# Altium footprint library SVP_Phoenix.PcbLib: 53 footprints (part 2 of 4)
Each footprint in its own frame and in the unit in brackets; x right, y up, seen from the top. Pads: shape width x height; smd on the part's side, far side on the other; paste and mask are expansions set on the pad; w line width, h text height; cw(c..) or ccw(c..) is an arc to the next point about the centre after c.
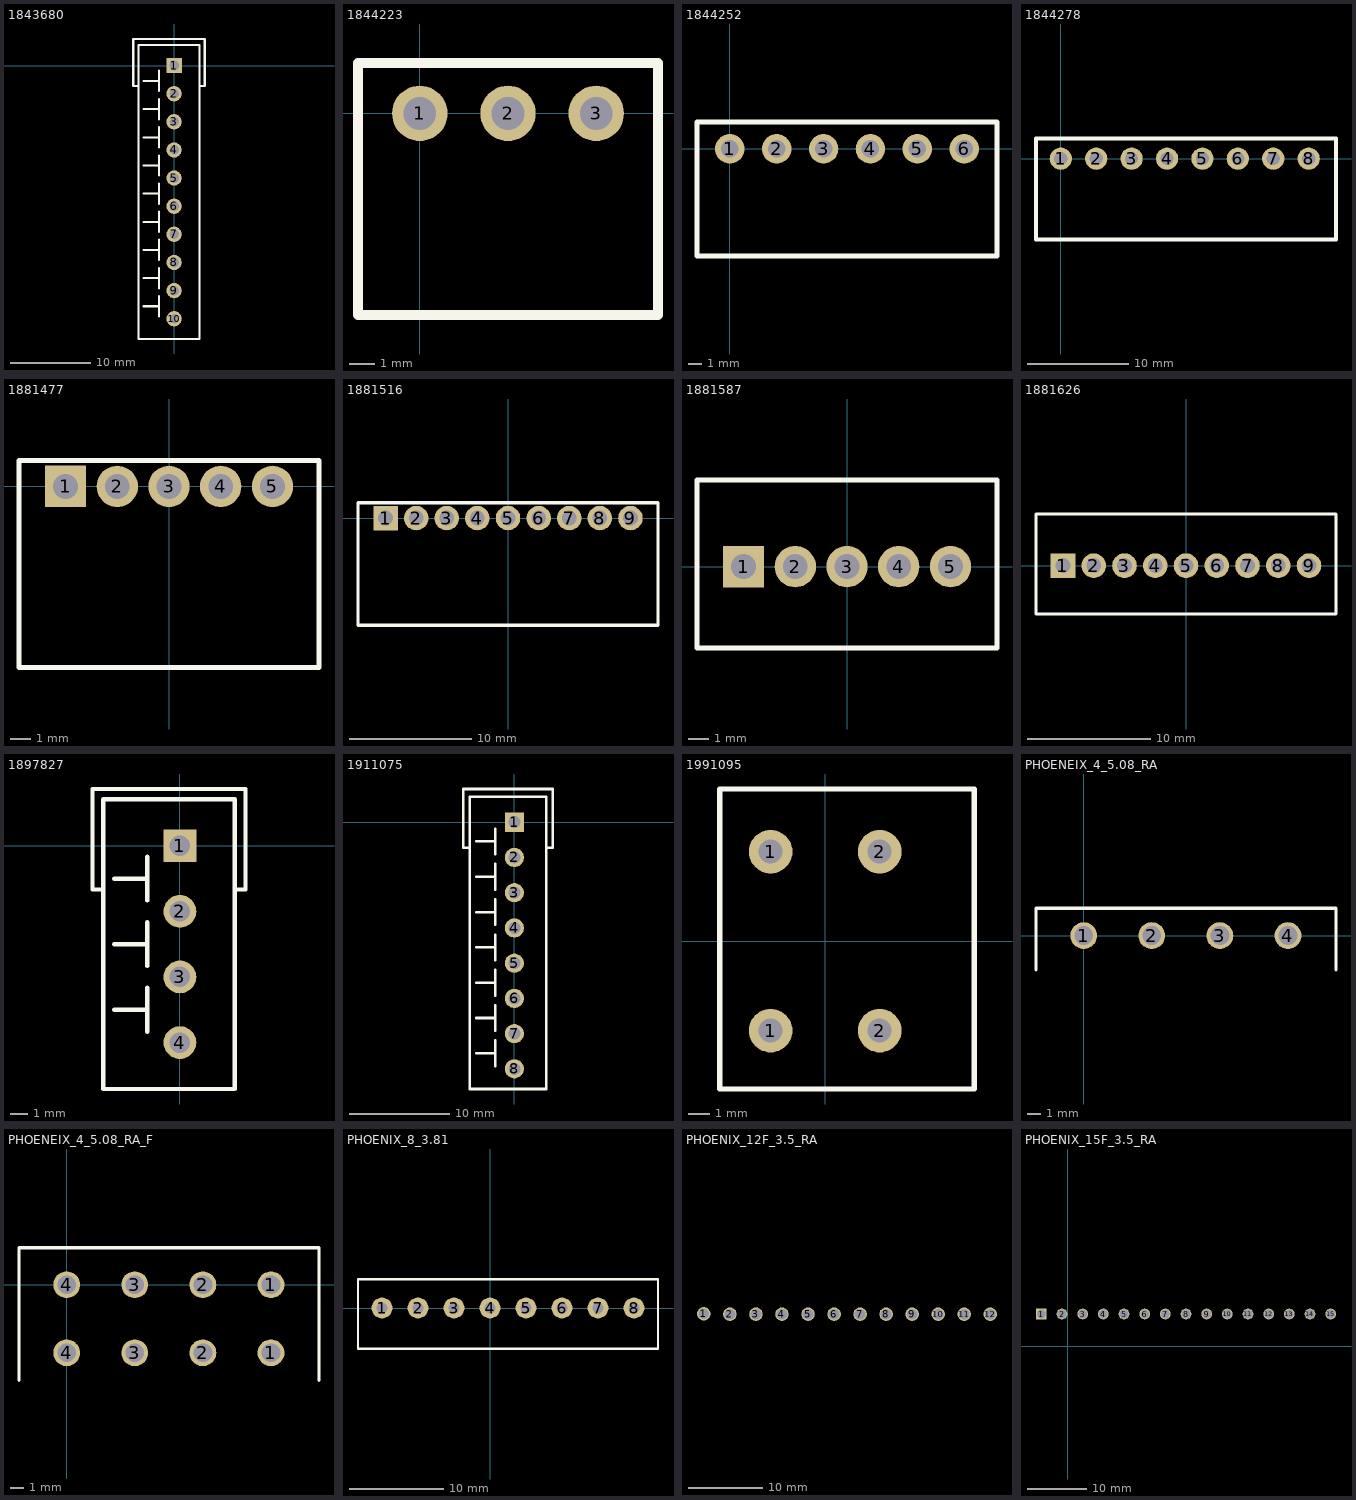
[diagram p1: the footprints below, top view; thin cyan lines are the x and y axes]

## 1843680 [mil] "10 Position Terminal Block Header, Male Pins, Shrouded (4 Side) 0.138\" (3.50mm) Vertical Through Hole"
pads (10):
  rect 75x75 hole 47: 1(0,0)
  round 75 hole 47: 2(0,-137.8) 3(0,-275.59) 4(0,-413.39) 5(0,-551.18) 6(0,-688.98) 7(0,-826.77) 8(0,-964.57) 9(0,-1102.36) 10(0,-1240.16)
Top Overlay:
  lines w10: -175,-1339.39 125,-1339.39 ; -175,-1338.58 -175,100 125,100 125,-1339.37 ; -175,-100 -200,-100 -200,130 150,130 150,-100 130,-100 ; -150,-1178.94 -75,-1178.94 ; -150,-1041.14 -75,-1041.14 ; -150,-902.95 -75,-902.95 ; -150,-765.55 -75,-765.55 ; -150,-627.76 -75,-627.76 ; -150,-489.57 -75,-489.57 ; -150,-351.38 -75,-351.38 ; -150,-213.19 -75,-213.19 ; -150,-75 -75,-75 ; -75,-1228.94 -75,-1128.94 ; -75,-1091.14 -75,-991.14 ; -75,-952.95 -75,-852.95 ; -75,-815.55 -75,-715.55 ; -75,-677.76 -75,-577.76 ; -75,-539.57 -75,-439.57 ; -75,-401.38 -75,-301.38 ; -75,-263.19 -75,-163.19 ; -75,-125 -75,-25
3D body "1843680.stp": height 362.7, standoff -133.36, extent -167.32,-1336.62 118.11,96.46

## 1844223 [mm]
pads (3):
  round 2.2 hole 1.3: 1(0,0) 2(3.5,0) 3(7,0)
Top Overlay:
  lines w0.381: -2.45,-8 -2.45,2 9.45,2 9.45,-8 -2.45,-8
3D body "1844223.stp": height 7.25, standoff -3.4, extent -2.458,-7.994 9.443,1.206

## 1844252 [mm]
pads (6):
  round 2.2 hole 1.3: 1(0,0) 2(3.5,0) 3(7,0) 4(10.5,0) 5(14,0) 6(17.5,0)
Top Overlay:
  lines w0.381: -2.45,-8 19.95,-8 19.95,2 -2.45,2 -2.45,-8
3D body "1844252.stp": height 7.25, standoff -3.4, extent -2.437,-8.001 19.963,1.199

## 1844278 [mm]
pads (8):
  round 2.2 hole 1.3: 1(0,0) 2(3.5,0) 3(7,0) 4(10.5,0) 5(14,0) 6(17.5,0) 7(21,0) 8(24.5,0)
Top Overlay:
  lines w0.381: -2.45,-8 27.2,-8 27.2,2 -2.45,2 -2.45,-8
3D body "1844278.stp": height 7.25, standoff -3.4, extent -2.457,-8.001 26.943,1.199

## 1881477 [mm] "5 Position Terminal Block Header, Male Pins, Shrouded (4 Side) 0.098\" (2.50mm) 90°, Right Angle Through Hole"
pads (5):
  rect 2x2 hole 1.2: 1(-5,0)
  round 2 hole 1.2: 2(-2.5,0) 3(0,0) 4(2.5,0) 5(5,0)
Top Overlay:
  lines w0.254: -7.25,-8.75 7.25,-8.75 7.25,1.25 -7.25,1.25 -7.25,-8.75
3D body "1881477_00.stp": height 8.11, standoff -3.49, extent -7.2,-8.85 7.2,1.25

## 1881516 [mm] "9 Position Terminal Block Header, Male Pins, Shrouded (4 Side) 0.098\" (2.50mm) 90°, Right Angle Through Hole"
pads (9):
  rect 2x2 hole 1.2: 1(-10,0)
  round 2 hole 1.2: 2(-7.5,0) 3(-5,0) 4(-2.5,0) 5(0,0) 6(2.5,0) 7(5,0) 8(7.5,0) 9(10,0)
Top Overlay:
  lines w0.254: -12.25,-8.75 -12.25,1.25 12.25,1.25 12.25,-8.75 -12.25,-8.75
3D body "1881516_00.stp": height 8.11, standoff -3.49, extent -12.2,-8.85 12.2,1.25

## 1881587 [mm] "5 Position Terminal Block Header, Male Pins, Shrouded (4 Side) 0.098\" (2.50mm) Vertical Through Hole"
pads (5):
  rect 2x2 hole 1.2: 1(-5,0)
  round 2 hole 1.2: 2(-2.5,0) 3(0,0) 4(2.5,0) 5(5,0)
Top Overlay:
  lines w0.254: -7.25,-3.937 7.25,-3.937 7.25,4.191 -7.25,4.191 -7.25,-3.937
3D body "1881587_00.stp": height 10.11, standoff -3.49, extent -7.2,-3.912 7.2,4.188

## 1881626 [mm] "9 Position Terminal Block Header, Male Pins, Shrouded (4 Side) 0.098\" (2.50mm) Vertical Through Hole"
pads (9):
  rect 2x2 hole 1.2: 1(-10,0)
  round 2 hole 1.2: 2(-7.5,0) 3(-5,0) 4(-2.5,0) 5(0,0) 6(2.5,0) 7(5,0) 8(7.5,0) 9(10,0)
Top Overlay:
  lines w0.254: -12.192,-3.937 -12.192,4.191 12.192,4.191 12.192,-3.937 -12.192,-3.937
3D body "1881626_00.stp": height 10.11, standoff -3.49, extent -12.2,-3.909 12.2,4.191

## 1897827 [mil]
pads (4):
  rect 75x75 hole 47: 1(0,0)
  round 75 hole 47: 2(0,-150) 3(0,-300) 4(0,-450)
Top Overlay:
  lines w10: -175,-100 -200,-100 -200,130 150,130 150,-100 130,-100 ; -150,-375 -75,-375 ; -150,-225 -75,-225 ; -150,-75 -75,-75 ; -75,-425 -75,-325 ; -75,-275 -75,-175 ; -75,-125 -75,-25 ; -175,-556.3 125,-556.3 125,106.3 -175,106.3 -175,-556.3

## 1911075 [mm] "8 Position Terminal Block Header, Male Pins, Shrouded (4 Side) 0.138\" (3.50mm) Vertical Through Hole"
pads (8):
  rect 1.905x1.905 hole 1.194: 1(0,0)
  round 1.905 hole 1.194: 2(0,-3.5) 3(0,-7) 4(0,-10.5) 5(0,-14) 6(0,-17.5) 7(0,-21) 8(0,-24.5)
Top Overlay:
  lines w0.254: -4.445,-2.54 -5.08,-2.54 -5.08,3.302 3.81,3.302 3.81,-2.54 3.302,-2.54 ; -3.81,-22.945 -1.905,-22.945 ; -3.81,-19.445 -1.905,-19.445 ; -3.81,-15.945 -1.905,-15.945 ; -3.81,-12.435 -1.905,-12.435 ; -3.81,-8.925 -1.905,-8.925 ; -3.81,-5.415 -1.905,-5.415 ; -3.81,-1.905 -1.905,-1.905 ; -1.905,-24.215 -1.905,-21.675 ; -1.905,-20.715 -1.905,-18.175 ; -1.905,-17.215 -1.905,-14.675 ; -1.905,-13.705 -1.905,-11.165 ; -1.905,-10.195 -1.905,-7.655 ; -1.905,-6.685 -1.905,-4.145 ; -1.905,-3.175 -1.905,-0.635 ; -4.445,-26.5 -4.445,2.54 3.175,2.54 3.175,-26.5 -4.445,-26.5
3D body "1911075.stp": height 9.21, standoff -3.79, extent -4.25,-26.95 3,2.45

## 1991095 [mm] "PCB terminal block - SPT 2,5/ 2-V-5,0 - 1991095"
pads (4):
  round 2 hole 1.1: 1(-2.5,-4.1) 1(-2.5,4.1) 2(2.5,-4.1) 2(2.5,4.1)
Top Overlay:
  lines w0.25: -4.825,-6.775 6.825,-6.775 6.825,6.975 -4.825,6.975 -4.825,-6.775
3D body "1991095_00.stp": height 14.41, standoff -2.59, extent -4.7,-6.65 6.7,6.85

## PHOENEIX_4_5.08_RA [mm]
pads (4):
  round 2 hole 1.4: 1(0,0) 2(5.08,0) 3(10.16,0) 4(15.24,0)
Top Overlay:
  lines w0.254: -3.556,-2.54 -3.556,2.032 18.821,2.032 18.821,-2.54
3D body "1923885.stp": height 8.6, standoff -3.5, extent -3.515,-9.996 18.805,2.007

## PHOENEIX_4_5.08_RA_F [mm]
pads (8):
  round 2 hole 1.4: 1(15.24,-5.08) 1(15.24,0) 2(10.16,-5.08) 2(10.16,0) 3(5.08,-5.08) 3(5.08,0) 4(0,-5.08) 4(0,0)
Top Overlay:
  lines w0.254: -3.556,-7.112 -3.556,2.743 18.821,2.743 18.821,-7.112
3D body "1943328.stp": height 10.36, standoff -3.34, extent -3.565,-16.206 18.755,2.794

## PHOENIX_8_3.81 [mm]
pads (8):
  round 2.2 hole 1.2: 1(-11.43,0) 2(-7.62,0) 3(-3.81,0) 4(0,0) 5(3.81,0) 6(7.62,0) 7(11.43,0) 8(15.24,0)
Top Overlay:
  lines w0.254: -13.97,-4.318 -13.97,3.048 17.78,3.048 17.78,-4.318 -13.97,-4.318
3D body "1803484.stp": height 9.2, standoff -3.4, extent -14.03,-4.202 17.84,3.048

## PHOENIX_12F_3.5_RA [mm]
pads (12):
  round 1.816 hole 1.45: 1(1205.916,1233.221) 2(1209.435,1233.17) 3(1212.935,1233.17) 4(1216.435,1233.17) 5(1219.935,1233.17) 6(1223.435,1233.17) 7(1226.935,1233.17) 8(1230.435,1233.17) 9(1233.935,1233.17) 10(1237.435,1233.17) 11(1240.935,1233.17) 12(1244.435,1233.17)
3D body "1897348.stp": height 7, standoff -3.5, extent 1199.019,1231.519 1251.319,1242.219

## PHOENIX_15F_3.5_RA [mm]
pads (15):
  rect 1.816x1.816 hole 1.45: 1(-4.5,5.5)
  round 1.816 hole 1.45: 2(-1,5.5) 3(2.5,5.5) 4(6,5.5) 5(9.5,5.5) 6(13,5.5) 7(16.5,5.5) 8(20,5.5) 9(23.5,5.5) 10(27,5.5) 11(30.5,5.5) 12(34,5.5) 13(37.5,5.5) 14(41,5.5) 15(44.5,5.5)
3D body "1897377.stp": height 7.01, standoff -3.49, extent -11.4,-3.45 51.4,7.25